# Altium footprint library Capacitors.PcbLib: 93 footprints (part 1 of 6)
Each footprint in its own frame and in the unit in brackets; x right, y up, seen from the top. Pads: shape width x height; smd on the part's side, far side on the other; paste and mask are expansions set on the pad; w line width, h text height; cw(c..) or ccw(c..) is an arc to the next point about the centre after c.
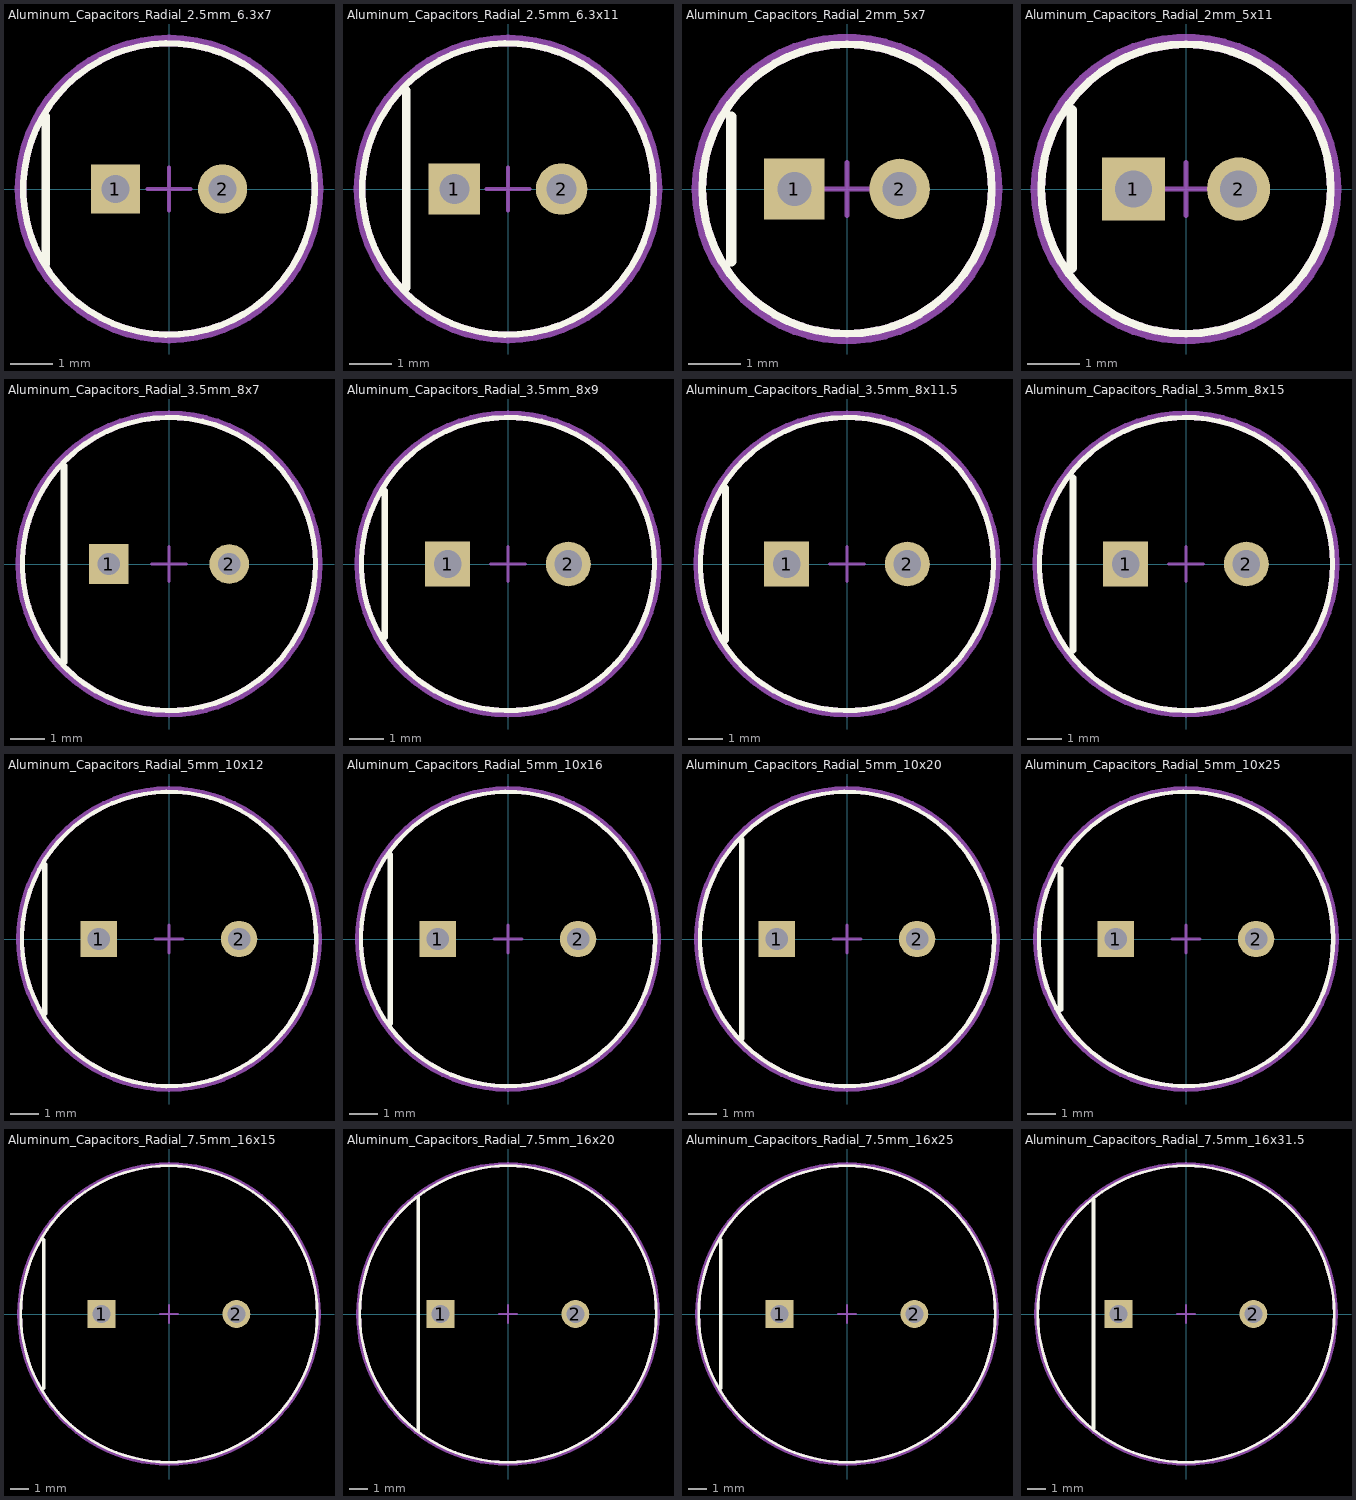
[diagram p0: the footprints below, top view; thin cyan lines are the x and y axes]

## Aluminum_Capacitors_Radial_2.5mm_6.3x7 [mm]
pads (2):
  rect 1.15x1.15 hole 0.65 paste-2539.97 mask+0: 1(-1.25,0)
  round 1.15 hole 0.65 paste-2539.97 mask+0: 2(1.25,0)
Top Overlay:
  circle w0.15: c0,0 r3.4
  lines w0.2: -2.875,-1.75 -2.875,1.7
Top 3D Body:
  circle w0.15: c0,0 r3.4
Top Courtyard:
  lines w0.2: -3.5,0 ccw(c0,0) 3.5,0 ccw(c0,0) -3.5,0
Top Component Center:
  lines w0.1: -0.5,0 0.5,0 ; 0,-0.5 0,0.5
3D body "Cap_Panasonic_ECEA1AKA101E_eec.STEP": height 0.25, standoff 0, extent -3.5,-3.5 3.5,3.5

## Aluminum_Capacitors_Radial_2.5mm_6.3x11 [mm]
pads (2):
  rect 1.2x1.2 hole 0.7 paste-2539.97 mask+0: 1(-1.25,0)
  round 1.2 hole 0.7 paste-2539.97 mask+0: 2(1.25,0)
Top Overlay:
  circle w0.15: c0,0 r3.4
  lines w0.2: -2.375,-2.3 -2.375,2.3
Top 3D Body:
  circle w0.15: c0,0 r3.4
Top Courtyard:
  lines w0.2: -3.5,0 ccw(c0,0) 3.5,0 ccw(c0,0) -3.5,0
Top Component Center:
  lines w0.1: -0.5,0 0.5,0 ; 0,-0.5 0,0.5
3D body "Cap_Panasonic_EEUFC1H330_eec.STEP": height 0.25, standoff 0, extent -3.5,-3.5 3.5,3.5

## Aluminum_Capacitors_Radial_2mm_5x7 [mm]
pads (2):
  rect 1.15x1.15 hole 0.65 paste-2539.97 mask+0: 1(-1,0)
  round 1.15 hole 0.65 paste-2539.97 mask+0: 2(1,0)
Top Overlay:
  circle w0.15: c0,0 r2.75
  lines w0.2: -2.2,-1.375 -2.2,1.375
Top 3D Body:
  circle w0.15: c0,0 r2.75
Top Courtyard:
  lines w0.2: -2.85,0 ccw(c0,0) 2.85,0 ccw(c0,0) -2.85,0
Top Component Center:
  lines w0.1: -0.5,0 0.5,0 ; 0,-0.5 0,0.5
3D body "Cap_Panasonic_EEAFC1C270E_eec.STEP": height 0.25, standoff 0, extent -2.85,-2.85 2.85,2.85

## Aluminum_Capacitors_Radial_2mm_5x11 [mm]
pads (2):
  rect 1.2x1.2 hole 0.7 paste-2539.97 mask+0: 1(-1,0)
  round 1.2 hole 0.7 paste-2539.97 mask+0: 2(1,0)
Top Overlay:
  circle w0.15: c0,0 r2.75
  lines w0.2: -2.175,-1.5 -2.175,1.5
Top 3D Body:
  circle w0.15: c0,0 r2.75
Top Courtyard:
  lines w0.2: -2.85,0 ccw(c0,0) 2.85,0 ccw(c0,0) -2.85,0
Top Component Center:
  lines w0.1: -0.5,0 0.5,0 ; 0,-0.5 0,0.5
3D body "Cap_Panasonic_ECA1CM220B_eec.STEP": height 0.25, standoff 0, extent -2.85,-2.85 2.85,2.85

## Aluminum_Capacitors_Radial_3.5mm_8x7 [mm]
pads (2):
  rect 1.15x1.15 hole 0.65 paste-2539.97 mask+0: 1(-1.75,0)
  round 1.15 hole 0.65 paste-2539.97 mask+0: 2(1.75,0)
Top Overlay:
  circle w0.15: c0,0 r4.25
  lines w0.2: -3.05,-2.85 -3.05,2.85
Top 3D Body:
  circle w0.15: c0,0 r4.25
Top Courtyard:
  lines w0.2: -4.35,0 ccw(c0,0) 4.35,0 ccw(c0,0) -4.35,0
Top Component Center:
  lines w0.1: -0.5,0 0.5,0 ; 0,-0.5 0,0.5
3D body "Cap_Panasonic_10SEPC270MD+C3_eec.STEP": height 0.25, standoff 0, extent -4.35,-4.35 4.35,4.35

## Aluminum_Capacitors_Radial_3.5mm_8x9 [mm]
pads (2):
  rect 1.3x1.3 hole 0.8 paste-2539.97 mask+0: 1(-1.75,0)
  round 1.3 hole 0.8 paste-2539.97 mask+0: 2(1.75,0)
Top Overlay:
  circle w0.15: c0,0 r4.25
  lines w0.2: -3.575,-2.125 -3.575,2.125
Top 3D Body:
  circle w0.15: c0,0 r4.25
Top Courtyard:
  lines w0.2: -4.35,0 ccw(c0,0) 4.35,0 ccw(c0,0) -4.35,0
Top Component Center:
  lines w0.1: -0.5,0 0.5,0 ; 0,-0.5 0,0.5
3D body "Cap_Panasonic_6SEPC470MX+TSS_eec.STEP": height 0.25, standoff 0, extent -4.35,-4.35 4.35,4.35

## Aluminum_Capacitors_Radial_3.5mm_8x11.5 [mm]
pads (2):
  rect 1.3x1.3 hole 0.8 paste-2539.97 mask+0: 1(-1.75,0)
  round 1.3 hole 0.8 paste-2539.97 mask+0: 2(1.75,0)
Top Overlay:
  circle w0.15: c0,0 r4.25
  lines w0.2: -3.525,-2.2 -3.525,2.2
Top 3D Body:
  circle w0.15: c0,0 r4.25
Top Courtyard:
  lines w0.2: -4.35,0 ccw(c0,0) 4.35,0 ccw(c0,0) -4.35,0
Top Component Center:
  lines w0.1: -0.5,0 0.5,0 ; 0,-0.5 0,0.5
3D body "Cap_Panasonic_EEUFC1A471_eec.STEP": height 0.25, standoff 0, extent -4.35,-4.35 4.35,4.35

## Aluminum_Capacitors_Radial_3.5mm_8x15 [mm]
pads (2):
  rect 1.3x1.3 hole 0.8 paste-2539.97 mask+0: 1(-1.75,0)
  round 1.3 hole 0.8 paste-2539.97 mask+0: 2(1.75,0)
Top Overlay:
  circle w0.15: c0,0 r4.25
  lines w0.2: -3.275,-2.5 -3.275,2.5
Top 3D Body:
  circle w0.15: c0,0 r4.25
Top Courtyard:
  lines w0.2: -4.35,0 ccw(c0,0) 4.35,0 ccw(c0,0) -4.35,0
Top Component Center:
  lines w0.1: -0.5,0 0.5,0 ; 0,-0.5 0,0.5
3D body "Cap_Panasonic_EEUFK1V271LB_eec.STEP": height 0.25, standoff 0, extent -4.35,-4.35 4.35,4.35

## Aluminum_Capacitors_Radial_5mm_10x12 [mm]
pads (2):
  rect 1.3x1.3 hole 0.8 paste-2539.97 mask+0: 1(-2.5,0)
  round 1.3 hole 0.8 paste-2539.97 mask+0: 2(2.5,0)
Top Overlay:
  circle w0.15: c0,0 r5.25
  lines w0.2: -4.425,-2.65 -4.425,2.65
Top 3D Body:
  circle w0.15: c0,0 r5.25
Top Courtyard:
  lines w0.2: -5.35,0 cw(c0,0) 5.35,0 cw(c0,0) -5.35,0
Top Component Center:
  lines w0.1: -0.5,0 0.5,0 ; 0,-0.5 0,0.5
3D body "Cap_Panasonic_EEUTA1H101_eec.STEP": height 0.25, standoff 0, extent -5.35,-5.35 5.35,5.35

## Aluminum_Capacitors_Radial_5mm_10x16 [mm]
pads (2):
  rect 1.3x1.3 hole 0.8 paste-2539.97 mask+0: 1(-2.5,0)
  round 1.3 hole 0.8 paste-2539.97 mask+0: 2(2.5,0)
Top Overlay:
  circle w0.15: c0,0 r5.25
  lines w0.2: -4.2,-3 -4.2,3
Top 3D Body:
  circle w0.15: c0,0 r5.25
Top Courtyard:
  lines w0.2: -5.35,0 cw(c0,0) 5.35,0 cw(c0,0) -5.35,0
Top Component Center:
  lines w0.1: -0.5,0 0.5,0 ; 0,-0.5 0,0.5
3D body "Cap_Panasonic_EEUTA1J470_eec.STEP": height 0.25, standoff 0, extent -5.35,-5.35 5.35,5.35

## Aluminum_Capacitors_Radial_5mm_10x20 [mm]
pads (2):
  rect 1.3x1.3 hole 0.8 paste-2539.97 mask+0: 1(-2.5,0)
  round 1.3 hole 0.8 paste-2539.97 mask+0: 2(2.5,0)
Top Overlay:
  circle w0.15: c0,0 r5.25
  lines w0.2: -3.75,-3.55 -3.75,3.55
Top 3D Body:
  circle w0.15: c0,0 r5.25
Top Courtyard:
  lines w0.2: -5.35,0 ccw(c0,0) 5.35,0 ccw(c0,0) -5.35,0
Top Component Center:
  lines w0.1: -0.5,0 0.5,0 ; 0,-0.5 0,0.5
3D body "Cap_Panasonic_EEUED2C470E_eec.STEP": height 0.25, standoff 0, extent -5.35,-5.35 5.35,5.35

## Aluminum_Capacitors_Radial_5mm_10x25 [mm]
pads (2):
  rect 1.3x1.3 hole 0.8 paste-2539.97 mask+0: 1(-2.5,0)
  round 1.3 hole 0.8 paste-2539.97 mask+0: 2(2.5,0)
Top Overlay:
  circle w0.15: c0,0 r5.25
  lines w0.2: -4.475,-2.5 -4.475,2.5
Top Assembly:
  text ".Designator" at 0,0.189 h1
Top 3D Body:
  circle w0.15: c0,0 r5.25
Top Courtyard:
  lines w0.2: -5.35,0 cw(c0,0) 5.35,0 cw(c0,0) -5.35,0
Top Component Center:
  lines w0.1: -0.5,0 0.5,0 ; 0,-0.5 0,0.5
3D body "Cap_Panasonic_EEUFC0J182E_eec.STEP": height 0.25, standoff 0, extent -5.35,-5.35 5.35,5.35

## Aluminum_Capacitors_Radial_7.5mm_16x15 [mm]
pads (2):
  rect 1.55x1.55 hole 1 paste-2539.97 mask+0: 1(-3.75,0)
  round 1.55 hole 1 paste-2539.97 mask+0: 2(3.75,0)
Top Overlay:
  circle w0.15: c0,0 r8.25
  lines w0.2: -6.975,-4.125 -6.975,4.125
Top 3D Body:
  circle w0.15: c0,0 r8.25
Top Courtyard:
  lines w0.2: -8.35,0 ccw(c0,0) 8.35,0 ccw(c0,0) -8.35,0
Top Component Center:
  lines w0.1: -0.5,0 0.5,0 ; 0,-0.5 0,0.5
3D body "Cap_Panasonic_EEUFK1E152SE_eec.STEP": height 0.25, standoff 0, extent -8.35,-8.35 8.35,8.35

## Aluminum_Capacitors_Radial_7.5mm_16x20 [mm]
pads (2):
  rect 1.55x1.55 hole 1 paste-2539.97 mask+0: 1(-3.75,0)
  round 1.55 hole 1 paste-2539.97 mask+0: 2(3.75,0)
Top Overlay:
  circle w0.15: c0,0 r8.25
  lines w0.2: -5,-6.5 -5,6.5
Top 3D Body:
  circle w0.15: c0,0 r8.25
Top Courtyard:
  lines w0.2: -8.35,0 cw(c0,0) 8.35,0 cw(c0,0) -8.35,0
Top Component Center:
  lines w0.1: -0.5,0 0.5,0 ; 0,-0.5 0,0.5
3D body "Cap_Panasonic_EEUED2C101SE_eec.STEP": height 0.25, standoff 0, extent -8.35,-8.35 8.35,8.35

## Aluminum_Capacitors_Radial_7.5mm_16x25 [mm]
pads (2):
  rect 1.55x1.55 hole 1 paste-2539.97 mask+0: 1(-3.75,0)
  round 1.55 hole 1 paste-2539.97 mask+0: 2(3.75,0)
Top Overlay:
  circle w0.15: c0,0 r8.25
  lines w0.2: -7.025,-4.125 -7.025,4.125
Top 3D Body:
  circle w0.15: c0,0 r8.25
Top Courtyard:
  lines w0.2: -8.35,0 cw(c0,0) 8.35,0 cw(c0,0) -8.35,0
Top Component Center:
  lines w0.1: -0.5,0 0.5,0 ; 0,-0.5 0,0.5
3D body "Cap_Panasonic_EEUED2C151E_eec.STEP": height 0.25, standoff 0, extent -8.35,-8.35 8.35,8.35

## Aluminum_Capacitors_Radial_7.5mm_16x31.5 [mm]
pads (2):
  rect 1.55x1.55 hole 1 paste-2539.97 mask+0: 1(-3.75,0)
  round 1.55 hole 1 paste-2539.97 mask+0: 2(3.75,0)
Top Overlay:
  circle w0.15: c0,0 r8.25
  lines w0.2: -5.15,-6.35 -5.15,6.35
Top 3D Body:
  circle w0.15: c0,0 r8.25
Top Courtyard:
  lines w0.2: -8.35,0 ccw(c0,0) 8.35,0 ccw(c0,0) -8.35,0
Top Component Center:
  lines w0.1: -0.5,0 0.5,0 ; 0,-0.5 0,0.5
3D body "Cap_Panasonic_EEUFC1J821E_eec.STEP": height 0.25, standoff 0, extent -8.35,-8.35 8.35,8.35